# Altium footprint library IC.PCBLIB: 359 footprints (part 11 of 23)
Each footprint in its own frame and in the unit in brackets; x right, y up, seen from the top. Pads: shape width x height; smd on the part's side, far side on the other; paste and mask are expansions set on the pad; w line width, h text height; cw(c..) or ccw(c..) is an arc to the next point about the centre after c.
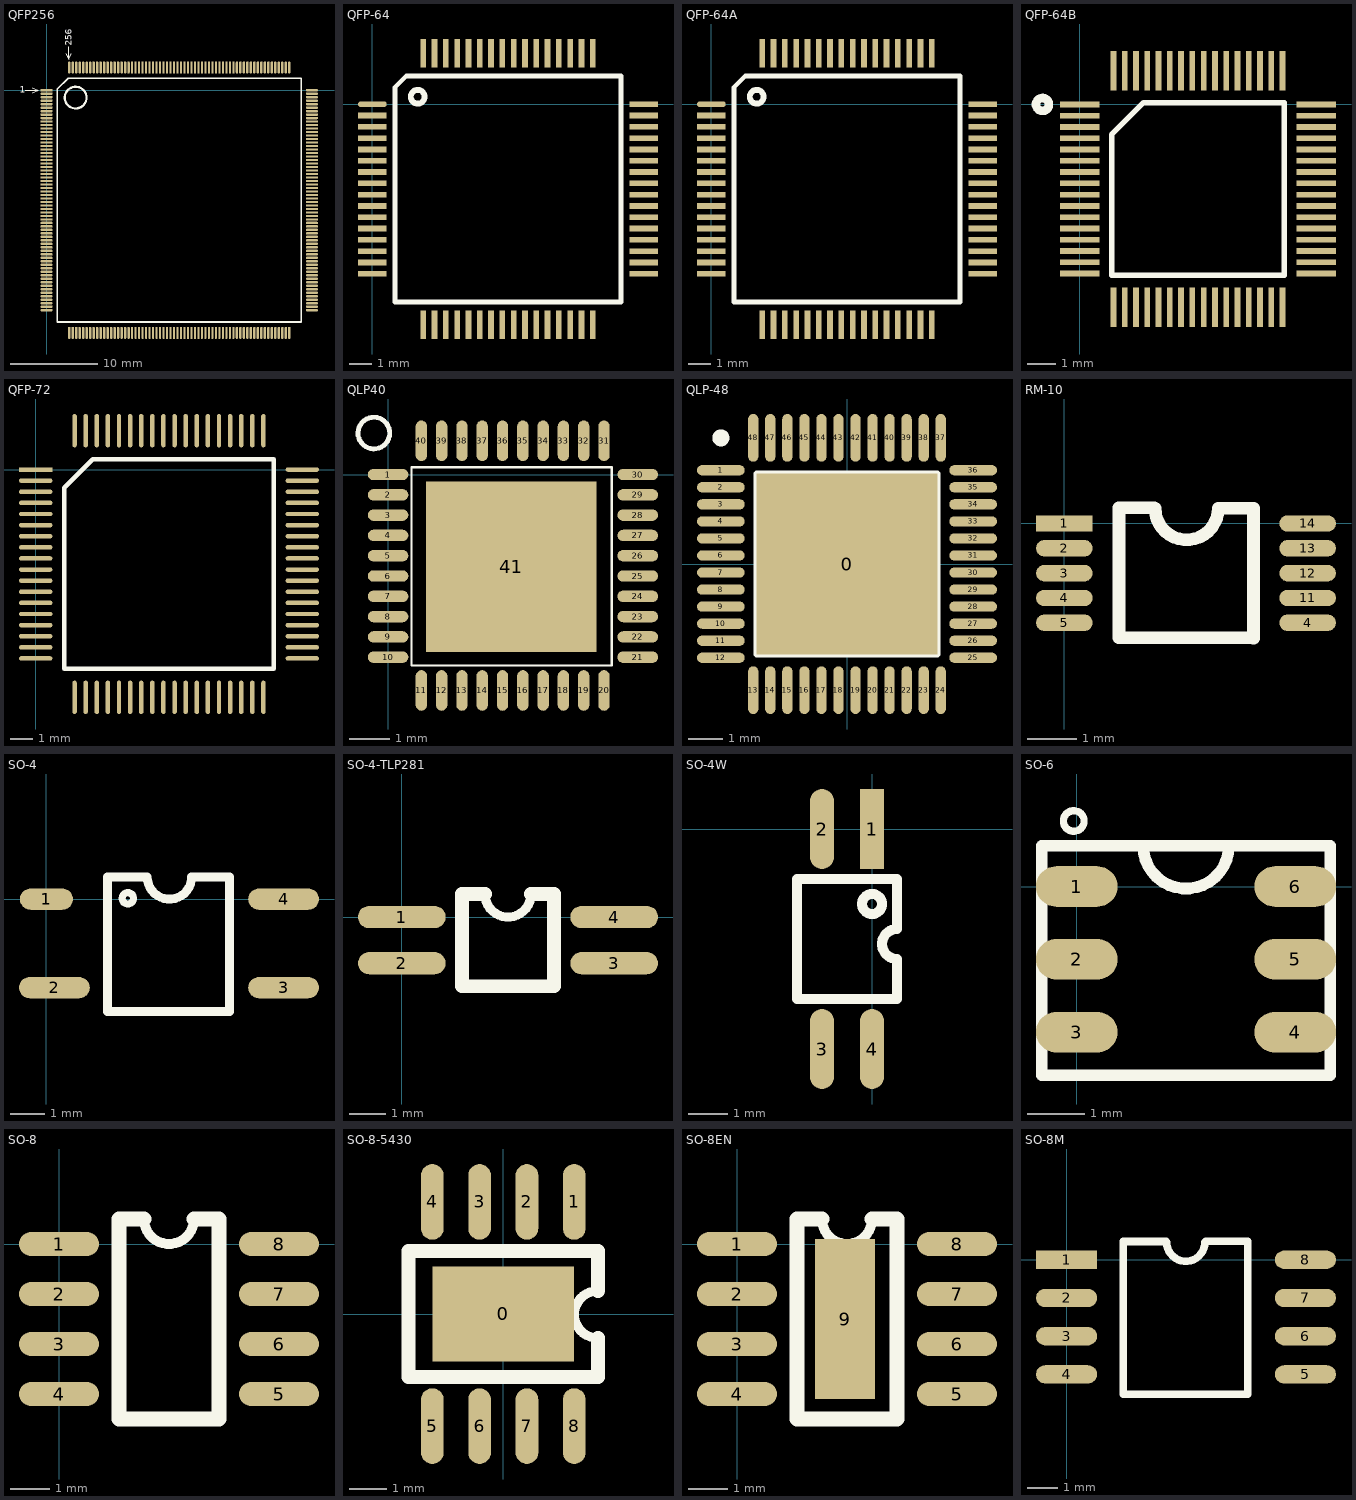
[diagram p10: the footprints below, top view; thin cyan lines are the x and y axes]

## QFP256 [mm]
pads (256):
  rect 1.4x0.26 smd: 1(0,0)
  oval 1.4x0.26 smd: 2(0,-0.4) 3(0,-0.8) 4(0,-1.2) 5(0,-1.6) 6(0,-2) 7(0,-2.4) 8(0,-2.8) 9(0,-3.2) 10(0,-3.6) 11(0,-4) 12(0,-4.4) 13(0,-4.8) 14(0,-5.2) 15(0,-5.6) 16(0,-6) 17(0,-6.4) 18(0,-6.8) 19(0,-7.2) 20(0,-7.6) 21(0,-8) 22(0,-8.4) 23(0,-8.8) 24(0,-9.2) 25(0,-9.6) 26(0,-10) 27(0,-10.4) 28(0,-10.8) 29(0,-11.2) 30(0,-11.6) 31(0,-12) 32(0,-12.4) 33(0,-12.8) 34(0,-13.2) 35(0,-13.6) 36(0,-14) 37(0,-14.4) 38(0,-14.8) 39(0,-15.2) 40(0,-15.6) 41(0,-16) 42(0,-16.4) 43(0,-16.8) 44(0,-17.2) 45(0,-17.6) 46(0,-18) 47(0,-18.4) 48(0,-18.8) 49(0,-19.2) 50(0,-19.6) 51(0,-20) 52(0,-20.4) 53(0,-20.8) 54(0,-21.2) 55(0,-21.6) 56(0,-22) 57(0,-22.4) 58(0,-22.8) 59(0,-23.2) 60(0,-23.6) 61(0,-24) 62(0,-24.4) 63(0,-24.8) 64(0,-25.2) 129(30.4,-25.2) 130(30.4,-24.8) 131(30.4,-24.4) 132(30.4,-24) 133(30.4,-23.6) 134(30.4,-23.2) 135(30.4,-22.8) 136(30.4,-22.4) 137(30.4,-22) 138(30.4,-21.6) 139(30.4,-21.2) 140(30.4,-20.8) 141(30.4,-20.4) 142(30.4,-20) 143(30.4,-19.6) 144(30.4,-19.2) 145(30.4,-18.8) 146(30.4,-18.4) 147(30.4,-18) 148(30.4,-17.6) 149(30.4,-17.2) 150(30.4,-16.8) 151(30.4,-16.4) 152(30.4,-16) 153(30.4,-15.6) 154(30.4,-15.2) 155(30.4,-14.8) 156(30.4,-14.4) 157(30.4,-14) 158(30.4,-13.6) 159(30.4,-13.2) 160(30.4,-12.8) 161(30.4,-12.4) 162(30.4,-12) 163(30.4,-11.6) 164(30.4,-11.2) 165(30.4,-10.8) 166(30.4,-10.4) 167(30.4,-10) 168(30.4,-9.6) 169(30.4,-9.2) 170(30.4,-8.8) 171(30.4,-8.4) 172(30.4,-8) 173(30.4,-7.6) 174(30.4,-7.2) 175(30.4,-6.8) 176(30.4,-6.4) 177(30.4,-6) 178(30.4,-5.6) 179(30.4,-5.2) 180(30.4,-4.8) 181(30.4,-4.4) 182(30.4,-4) 183(30.4,-3.6) 184(30.4,-3.2) 185(30.4,-2.8) 186(30.4,-2.4) 187(30.4,-2) 188(30.4,-1.6) 189(30.4,-1.2) 190(30.4,-0.8) 191(30.4,-0.4) 192(30.4,0)
  oval 0.26x1.4 smd: 65(2.6,-27.8) 66(3,-27.8) 67(3.4,-27.8) 68(3.8,-27.8) 69(4.2,-27.8) 70(4.6,-27.8) 71(5,-27.8) 72(5.4,-27.8) 73(5.8,-27.8) 74(6.2,-27.8) 75(6.6,-27.8) 76(7,-27.8) 77(7.4,-27.8) 78(7.8,-27.8) 79(8.2,-27.8) 80(8.6,-27.8) 81(9,-27.8) 82(9.4,-27.8) 83(9.8,-27.8) 84(10.2,-27.8) 85(10.6,-27.8) 86(11,-27.8) 87(11.4,-27.8) 88(11.8,-27.8) 89(12.2,-27.8) 90(12.6,-27.8) 91(13,-27.8) 92(13.4,-27.8) 93(13.8,-27.8) 94(14.2,-27.8) 95(14.6,-27.8) 96(15,-27.8) 97(15.4,-27.8) 98(15.8,-27.8) 99(16.2,-27.8) 100(16.6,-27.8) 101(17,-27.8) 102(17.4,-27.8) 103(17.8,-27.8) 104(18.2,-27.8) 105(18.6,-27.8) 106(19,-27.8) 107(19.4,-27.8) 108(19.8,-27.8) 109(20.2,-27.8) 110(20.6,-27.8) 111(21,-27.8) 112(21.4,-27.8) 113(21.8,-27.8) 114(22.2,-27.8) 115(22.6,-27.8) 116(23,-27.8) 117(23.4,-27.8) 118(23.8,-27.8) 119(24.2,-27.8) 120(24.6,-27.8) 121(25,-27.8) 122(25.4,-27.8) 123(25.8,-27.8) 124(26.2,-27.8) 125(26.6,-27.8) 126(27,-27.8) 127(27.4,-27.8) 128(27.8,-27.8) 193(27.8,2.6) 194(27.4,2.6) 195(27,2.6) 196(26.6,2.6) 197(26.2,2.6) 198(25.8,2.6) 199(25.4,2.6) 200(25,2.6) 201(24.6,2.6) 202(24.2,2.6) 203(23.8,2.6) 204(23.4,2.6) 205(23,2.6) 206(22.6,2.6) 207(22.2,2.6) 208(21.8,2.6) 209(21.4,2.6) 210(21,2.6) 211(20.6,2.6) 212(20.2,2.6) 213(19.8,2.6) 214(19.4,2.6) 215(19,2.6) 216(18.6,2.6) 217(18.2,2.6) 218(17.8,2.6) 219(17.4,2.6) 220(17,2.6) 221(16.6,2.6) 222(16.2,2.6) 223(15.8,2.6) 224(15.4,2.6) 225(15,2.6) 226(14.6,2.6) 227(14.2,2.6) 228(13.8,2.6) 229(13.4,2.6) 230(13,2.6) 231(12.6,2.6) 232(12.2,2.6) 233(11.8,2.6) 234(11.4,2.6) 235(11,2.6) 236(10.6,2.6) 237(10.2,2.6) 238(9.8,2.6) 239(9.4,2.6) 240(9,2.6) 241(8.6,2.6) 242(8.2,2.6) 243(7.8,2.6) 244(7.4,2.6) 245(7,2.6) 246(6.6,2.6) 247(6.2,2.6) 248(5.8,2.6) 249(5.4,2.6) 250(5,2.6) 251(4.6,2.6) 252(4.2,2.6) 253(3.8,2.6) 254(3.4,2.6) 255(3,2.6) 256(2.6,2.6)
TopOverlay:
  circle w0.254: c3.333,-0.85 r1.247
  lines w0.127: -2.44,0 -0.97,0 ; -1.62,-0.32 -0.97,0 ; -1.62,0.29 -0.97,0 ; 2.22,4.18 2.54,3.53 ; 2.54,5 2.54,3.53 ; 2.83,4.18 2.54,3.53
  lines w0.2: 1.235,-26.565 29.165,-26.565 29.165,1.365 2.47,1.365 1.235,0.13 1.235,-26.565
  text "1" at -3.05,-0.32 h0.76
  text "256" at 2.91,5.1 h0.76

## QFP-64 [mil]
pads (64):
  oval 50x10 smd: 1(0,0)
  rect 50x10 smd: 2(0,-19.69) 3(0,-39.37) 4(0,-59.06) 5(0,-78.74) 6(0,-98.43) 7(0,-118.11) 8(0,-137.8) 9(0,-157.48) 10(0,-177.17) 11(0,-196.85) 12(0,-216.54) 13(0,-236.22) 14(0,-255.91) 15(0,-275.59) 16(0,-295.28) 33(472.44,-295.28) 34(472.44,-275.59) 35(472.44,-255.91) 36(472.44,-236.22) 37(472.44,-216.54) 38(472.44,-196.85) 39(472.44,-177.17) 40(472.44,-157.48) 41(472.44,-137.8) 42(472.44,-118.11) 43(472.44,-98.43) 44(472.44,-78.74) 45(472.44,-59.06) 46(472.44,-39.37) 47(472.44,-19.69) 48(472.44,0)
  rect 10x50 smd: 17(88.58,-383.86) 18(108.27,-383.86) 19(127.95,-383.86) 20(147.64,-383.86) 21(167.32,-383.86) 22(187.01,-383.86) 23(206.69,-383.86) 24(226.38,-383.86) 25(246.06,-383.86) 26(265.75,-383.86) 27(285.43,-383.86) 28(305.12,-383.86) 29(324.8,-383.86) 30(344.49,-383.86) 31(364.17,-383.86) 32(383.86,-383.86) 49(383.86,88.58) 50(364.17,88.58) 51(344.49,88.58) 52(324.8,88.58) 53(305.12,88.58) 54(285.43,88.58) 55(265.75,88.58) 56(246.06,88.58) 57(226.38,88.58) 58(206.69,88.58) 59(187.01,88.58) 60(167.32,88.58) 61(147.64,88.58) 62(127.95,88.58) 63(108.27,88.58) 64(88.58,88.58)
TopOverlay:
  circle w10: c78.96,13 r12.04
  lines w8: 39.37,-344.49 433.07,-344.49 433.07,49.21 59.05,49.21 39.37,29.53 39.37,-344.49

## QFP-64A [mil]
pads (64):
  oval 50x10 smd: 1(0,0)
  rect 50x10 smd: 2(0,-19.69) 3(0,-39.37) 4(0,-59.06) 5(0,-78.74) 6(0,-98.43) 7(0,-118.11) 8(0,-137.8) 9(0,-157.48) 10(0,-177.17) 11(0,-196.85) 12(0,-216.54) 13(0,-236.22) 14(0,-255.91) 15(0,-275.59) 16(0,-295.28) 33(472.44,-295.28) 34(472.44,-275.59) 35(472.44,-255.91) 36(472.44,-236.22) 37(472.44,-216.54) 38(472.44,-196.85) 39(472.44,-177.17) 40(472.44,-157.48) 41(472.44,-137.8) 42(472.44,-118.11) 43(472.44,-98.43) 44(472.44,-78.74) 45(472.44,-59.06) 46(472.44,-39.37) 47(472.44,-19.69) 48(472.44,0)
  rect 10x50 smd: 17(88.58,-383.86) 18(108.27,-383.86) 19(127.95,-383.86) 20(147.64,-383.86) 21(167.32,-383.86) 22(187.01,-383.86) 23(206.69,-383.86) 24(226.38,-383.86) 25(246.06,-383.86) 26(265.75,-383.86) 27(285.43,-383.86) 28(305.12,-383.86) 29(324.8,-383.86) 30(344.49,-383.86) 31(364.17,-383.86) 32(383.86,-383.86) 49(383.86,88.58) 50(364.17,88.58) 51(344.49,88.58) 52(324.8,88.58) 53(305.12,88.58) 54(285.43,88.58) 55(265.75,88.58) 56(246.06,88.58) 57(226.38,88.58) 58(206.69,88.58) 59(187.01,88.58) 60(167.32,88.58) 61(147.64,88.58) 62(127.95,88.58) 63(108.27,88.58) 64(88.58,88.58)
TopOverlay:
  circle w10: c78.96,13 r12.04
  lines w8: 39.37,-344.49 39.37,29.53 59.05,49.21 433.07,49.21 433.07,-344.49 39.37,-344.49

## QFP-64B [mil]
pads (64):
  rect 55x8 smd: 1(0,0) 2(0,-15.75) 3(0,-31.5) 4(0,-47.24) 5(0,-62.99) 6(0,-78.74) 7(0,-94.49) 8(0,-110.24) 9(0,-125.98) 10(0,-141.73) 11(0,-157.48) 12(0,-173.23) 13(0,-188.98) 14(0,-204.72) 15(0,-220.47) 16(0,-236.22) 33(330.71,-236.22) 34(330.71,-220.47) 35(330.71,-204.72) 36(330.71,-188.98) 37(330.71,-173.23) 38(330.71,-157.48) 39(330.71,-141.73) 40(330.71,-125.98) 41(330.71,-110.24) 42(330.71,-94.49) 43(330.71,-78.74) 44(330.71,-62.99) 45(330.71,-47.24) 46(330.71,-31.5) 47(330.71,-15.75) 48(330.71,0)
  rect 8x55 smd: 17(47.24,-283.46) 18(62.99,-283.46) 19(78.74,-283.46) 20(94.49,-283.46) 21(110.24,-283.46) 22(125.98,-283.46) 23(141.73,-283.46) 24(157.48,-283.46) 25(173.23,-283.46) 26(188.98,-283.46) 27(204.72,-283.46) 28(220.47,-283.46) 29(236.22,-283.46) 30(251.97,-283.46) 31(267.72,-283.46) 32(283.46,-283.46) 49(283.46,47.24) 50(267.72,47.24) 51(251.97,47.24) 52(236.22,47.24) 53(220.47,47.24) 54(204.72,47.24) 55(188.98,47.24) 56(173.23,47.24) 57(157.48,47.24) 58(141.73,47.24) 59(125.98,47.24) 60(110.24,47.24) 61(94.49,47.24) 62(78.74,47.24) 63(62.99,47.24) 64(47.24,47.24)
TopOverlay:
  circle w12: c-52.02,0 r9.02
  lines w7.87: 44.69,-238.78 44.69,-42.13 89.37,2.56 286.02,2.56 286.02,-238.78 44.69,-238.78

## QFP-72 [mm]
pads (72):
  rect 1.5x0.2 smd: 1(0,0)
  oval 1.5x0.2 smd: 2(0,-0.5) 3(0,-1) 4(0,-1.5) 5(0,-2) 6(0,-2.5) 7(0,-3) 8(0,-3.5) 9(0,-4) 10(0,-4.5) 11(0,-5) 12(0,-5.5) 13(0,-6) 14(0,-6.5) 15(0,-7) 16(0,-7.5) 17(0,-8) 18(0,-8.5) 37(12,-8.5) 38(12,-8) 39(12,-7.5) 40(12,-7) 41(12,-6.5) 42(12,-6) 43(12,-5.5) 44(12,-5) 45(12,-4.5) 46(12,-4) 47(12,-3.5) 48(12,-3) 49(12,-2.5) 50(12,-2) 51(12,-1.5) 52(12,-1) 53(12,-0.5) 54(12,0)
  oval 0.2x1.5 smd: 19(1.75,-10.25) 20(2.25,-10.25) 21(2.75,-10.25) 22(3.25,-10.25) 23(3.75,-10.25) 24(4.25,-10.25) 25(4.75,-10.25) 26(5.25,-10.25) 27(5.75,-10.25) 28(6.25,-10.25) 29(6.75,-10.25) 30(7.25,-10.25) 31(7.75,-10.25) 32(8.25,-10.25) 33(8.75,-10.25) 34(9.25,-10.25) 35(9.75,-10.25) 36(10.25,-10.25) 55(10.25,1.75) 56(9.75,1.75) 57(9.25,1.75) 58(8.75,1.75) 59(8.25,1.75) 60(7.75,1.75) 61(7.25,1.75) 62(6.75,1.75) 63(6.25,1.75) 64(5.75,1.75) 65(5.25,1.75) 66(4.75,1.75) 67(4.25,1.75) 68(3.75,1.75) 69(3.25,1.75) 70(2.75,1.75) 71(2.25,1.75) 72(1.75,1.75)
TopOverlay:
  lines w0.2: 1.285,-8.965 1.285,-0.82 2.57,0.465 10.715,0.465 10.715,-8.965 1.285,-8.965

## QLP40 [mm]
pads (41):
  oval 1x0.28 smd: 1(0,0) 2(0,-0.5) 3(0,-1) 4(0,-1.5) 5(0,-2) 6(0,-2.5) 7(0,-3) 8(0,-3.5) 9(0,-4) 10(0,-4.5) 21(6.15,-4.5) 22(6.15,-4) 23(6.15,-3.5) 24(6.15,-3) 25(6.15,-2.5) 26(6.15,-2) 27(6.15,-1.5) 28(6.15,-1) 29(6.15,-0.5) 30(6.15,0)
  oval 0.28x1 smd: 11(0.82,-5.32) 12(1.32,-5.32) 13(1.82,-5.32) 14(2.32,-5.32) 15(2.82,-5.32) 16(3.32,-5.32) 17(3.82,-5.32) 18(4.32,-5.32) 19(4.82,-5.32) 20(5.32,-5.32) 31(5.32,0.83) 32(4.82,0.83) 33(4.32,0.83) 34(3.82,0.83) 35(3.32,0.83) 36(2.82,0.83) 37(2.32,0.83) 38(1.82,0.83) 39(1.32,0.83) 40(0.82,0.83)
  rect 4.2x4.2 smd: 41(3.04,-2.27)
TopOverlay:
  lines w0.051: 0.58,-4.71 0.58,0.18 5.51,0.18 5.51,-4.71 0.58,-4.71
  lines w0.12: 0.04,1.009 cw(c-0.35,1.021) 0.04,1.013

## QLP-48 [mm] "QLP-48"
height 1.6
pads (49):
  rect 5.3x5.3 smd: 0(0,0)
  oval 1.4x0.3 smd: 1(-3.7,2.75) 2(-3.7,2.25) 3(-3.7,1.75) 4(-3.7,1.25) 5(-3.7,0.75) 6(-3.7,0.25) 7(-3.7,-0.25) 8(-3.7,-0.75) 9(-3.7,-1.25) 10(-3.7,-1.75) 11(-3.7,-2.25) 12(-3.7,-2.75) 25(3.7,-2.75) 26(3.7,-2.25) 27(3.7,-1.75) 28(3.7,-1.25) 29(3.7,-0.75) 30(3.7,-0.25) 31(3.7,0.25) 32(3.7,0.75) 33(3.7,1.25) 34(3.7,1.75) 35(3.7,2.25) 36(3.7,2.75)
  oval 0.3x1.4 smd: 13(-2.75,-3.7) 14(-2.25,-3.7) 15(-1.75,-3.7) 16(-1.25,-3.7) 17(-0.75,-3.7) 18(-0.25,-3.7) 19(0.25,-3.7) 20(0.75,-3.7) 21(1.25,-3.7) 22(1.75,-3.7) 23(2.25,-3.7) 24(2.75,-3.7) 37(2.75,3.7) 38(2.25,3.7) 39(1.75,3.7) 40(1.25,3.7) 41(0.75,3.7) 42(0.25,3.7) 43(-0.25,3.7) 44(-0.75,3.7) 45(-1.25,3.7) 46(-1.75,3.7) 47(-2.25,3.7) 48(-2.75,3.7)
TopOverlay:
  circle w0.25: c-3.7,3.7 r0.125
  lines w0.2: -2.65,-2.65 -2.65,2.65 2.65,2.65 2.65,-2.65 -2.65,-2.65

## RM-10 [mm]
pads (10):
  rect 1.143x0.33 smd: 1(0,0)
  oval 1.143x0.33 smd: 2(0,-0.5) 3(0,-1) 4(0,-1.5) 4(4.9,-2) 5(0,-2) 11(4.9,-1.5) 12(4.9,-1) 13(4.9,-0.5) 14(4.9,0)
TopOverlay:
  lines w0.254: 1.814,0.32 1.1,0.32 1.1,-2.3 3.799,-2.3 ; 1.829,0.305 ccw(c2.464,0.305) 3.099,0.305 3.806,0.305 ; 3.81,-2.311 3.81,0.309

## SO-4 [mil]
pads (4):
  oval 60x24 smd: 1(0,0)
  oval 80x24 smd: 2(9,-100) 3(268,-100) 4(268,0)
TopOverlay:
  circle w8: c92,1 r6.4
  lines w10: 69,-127 207,-127 207,25 164,25 cw(c139,25) 114,25 69,25 69,-127

## SO-4-TLP281 [mil]
pads (4):
  oval 95x24 smd: 1(0,0) 2(0,-50) 3(230,-50) 4(230,0)
TopOverlay:
  lines w10: 90,25 ccw(c115,25) 140,25
  lines w15: 90,25 65,25 65,-75 165,-75 165,25 140,25

## SO-4W [mil]
pads (4):
  rect 24x80 smd: 1(0,0)
  oval 24x80 smd: 2(-50,0) 3(-50,-220) 4(0,-220)
TopOverlay:
  circle w10: c0,-75 r10
  lines w10: -75,-170 25,-170 25,-130 cw(c25,-115) 25,-100 25,-50 -75,-50 -75,-170

## SO-6 [mil]
pads (6):
  oval 56x28 smd: 1(0,0) 2(0,-50) 3(0,-100) 4(150,-100) 5(150,-50) 6(150,0)
TopOverlay:
  circle w5: c-2.07,45 r7.07
  lines w8: 45.59,28 ccw(c75,28) 104.41,28 ; -24,-129.48 174,-129.48 174,28 -24,28 -24,-129.48

## SO-8 [mil]
pads (8):
  oval 80x24 smd: 1(0,0) 2(0,-50) 3(0,-100) 4(0,-150) 5(220,-150) 6(220,-100) 7(220,-50) 8(220,0)
TopOverlay:
  lines w10: 85,25 ccw(c110,25) 135,25
  lines w15: 85,25 60,25 60,-175 160,-175 160,25 135,25

## SO-8-5430 [mil]
pads (9):
  rect 150x100 smd: 0(0,0)
  oval 24x80 smd: 1(75,118.5) 2(25,118.5) 3(-25,118.5) 4(-75,118.5) 5(-75,-118.5) 6(-25,-118.5) 7(25,-118.5) 8(75,-118.5)
TopOverlay:
  lines w10: 100,-25.5 cw(c100,-0.5) 100,24.5
  lines w15: 100,-25.5 100,-66.5 -100,-66.5 -100,66.5 100,66.5 100,24.5

## SO-8EN [mil]
pads (9):
  oval 80x24 smd: 1(0,0) 2(0,-50) 3(0,-100) 4(0,-150) 5(220,-150) 6(220,-100) 7(220,-50) 8(220,0)
  rect 60x160 smd: 9(108,-75)
TopOverlay:
  lines w10: 85,25 ccw(c110,25) 135,25
  lines w15: 85,25 60,25 60,-175 160,-175 160,25 135,25

## SO-8M [mil]
pads (8):
  rect 80x24 smd: 1(0,0)
  oval 80x24 smd: 2(0,-50) 3(0,-100) 4(0,-150) 5(312.6,-150) 6(312.6,-100) 7(312.6,-50) 8(312.6,0)
TopOverlay:
  lines w10: 130.06,23.94 74.39,23.94 74.39,-176.06 237.01,-176.06 ; 131,23 ccw(c156,23) 181,23 ; 182,24 237.01,24 ; 236.01,23 237.01,24 ; 237.01,-176 237.01,24